# Altium footprint library GyokuRe.PcbLib: 1248 footprints (part 45 of 78)
Each footprint in its own frame and in the unit in brackets; x right, y up, seen from the top. Pads: shape width x height; smd on the part's side, far side on the other; paste and mask are expansions set on the pad; w line width, h text height; cw(c..) or ccw(c..) is an arc to the next point about the centre after c.
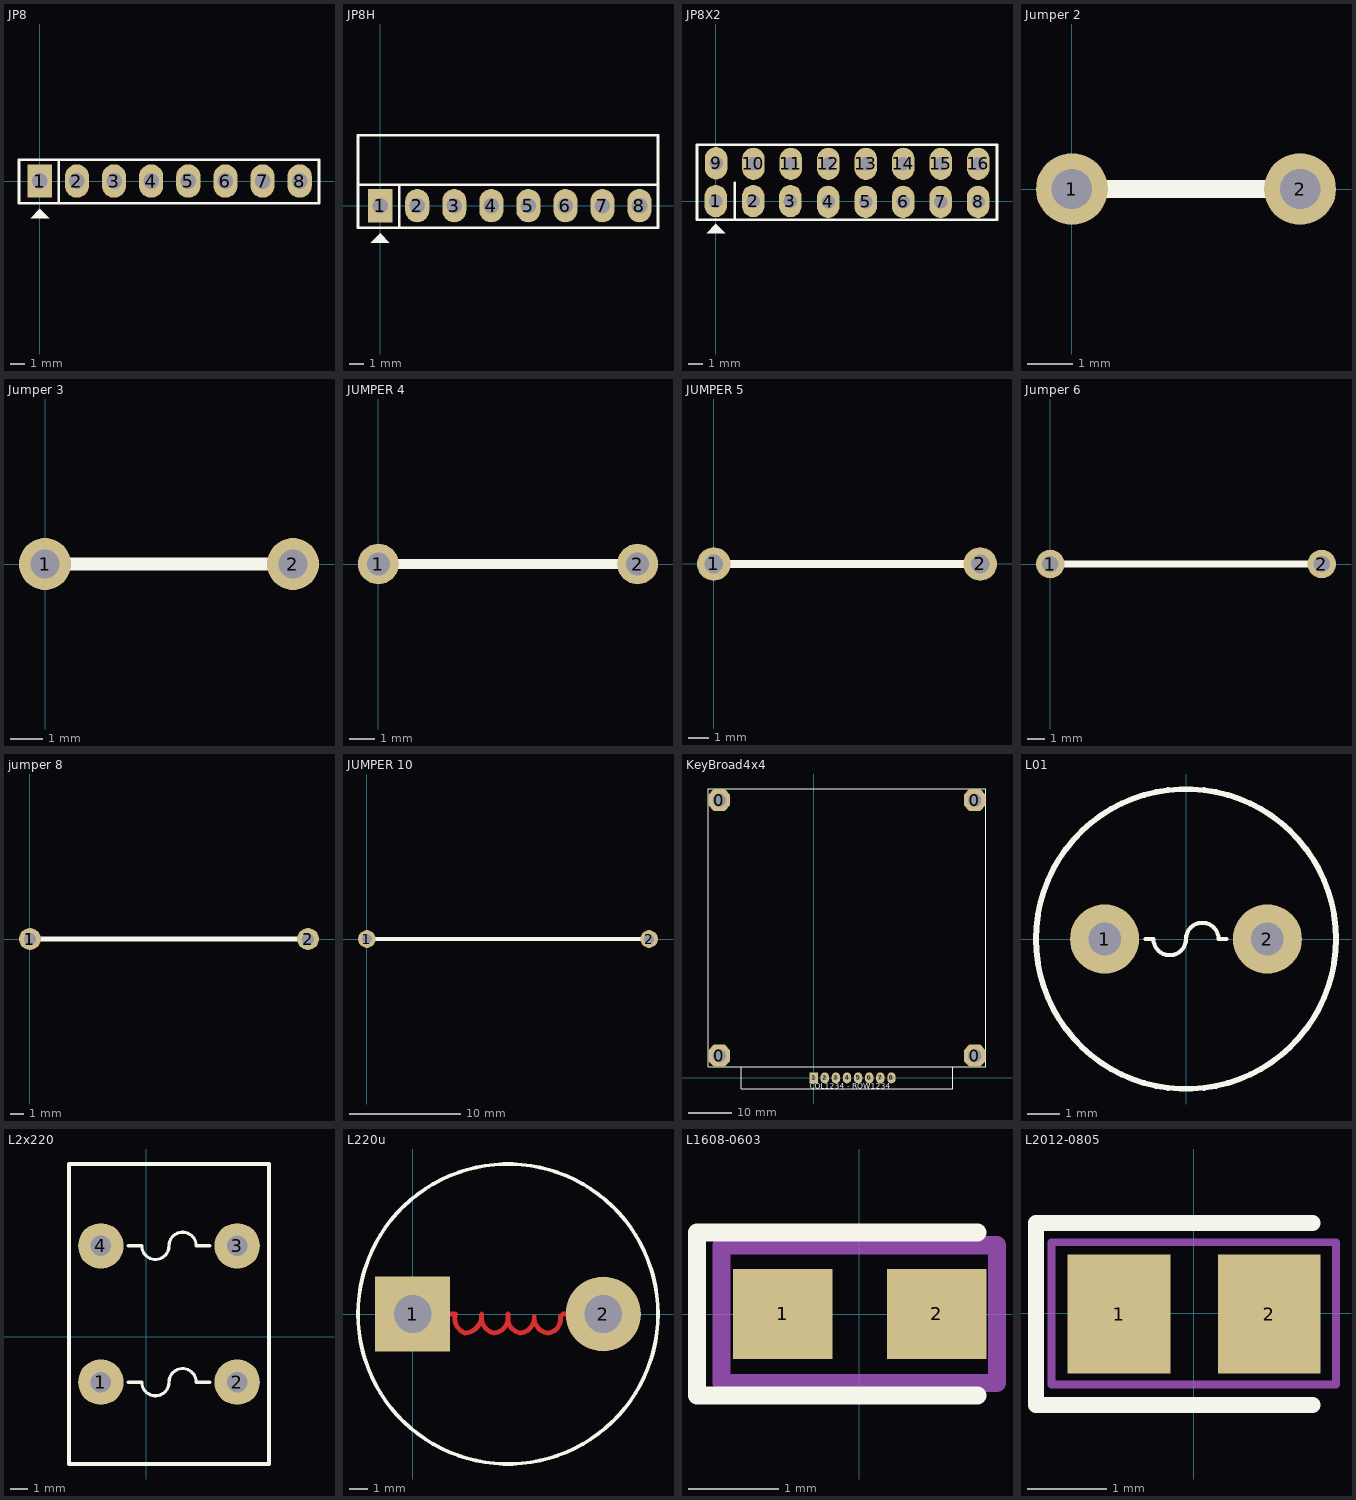
[diagram p44: the footprints below, top view; thin cyan lines are the x and y axes]

## JP8 [mil] "JP8"
height 200
pads (8):
  rect 65x90 hole 42: 1(0,0)
  oval 65x90 hole 42: 2(100,0) 3(200,0) 4(300,0) 5(400,0) 6(500,0) 7(600,0) 8(700,0)
Top Overlay:
  region: 0,-75 -25,-100 25,-100
  lines w7: 51,-60 51,56 ; -56,-60 752,-60 752,57 -56,57 -56,-60
3D body "JP1-8.stp": height 323.43, standoff -117.51, extent -48.03,-50 748.03,48.43

## JP8H [mil]
pads (8):
  rect 65x90 hole 42: 1(0,0)
  oval 65x90 hole 42: 2(100,0) 3(200,0) 4(300,0) 5(400,0) 6(500,0) 7(600,0) 8(700,0)
Top Overlay:
  region: 0,-75 -25,-100 25,-100
  lines w7: 51,-60 51,56 ; -60,57 -60,190 750,190 750,57 ; -60,57 750,57 ; -60,57 -60,-60 750,-60 750,57
3D body "JP8H.stp": height 49.21, standoff -143.7, extent -46.06,-14.96 746.06,423.62

## JP8X2 [mil]
pads (16):
  oval 60x86 hole 36: 1(-0.5,0.5) 2(99.5,0.5) 3(198.5,0.5) 4(299.5,-1.5) 5(399.5,-1.5) 6(499.5,-1.5) 7(599.5,-1.5) 8(699.5,-1.5) 9(0.5,101.5) 10(100,100) 11(200,100) 12(300,100) 13(400,100) 14(500,100) 15(600,100) 16(700,100)
Top Overlay:
  region: 0,-60 -25,-85 25,-85
  lines w7: 50,-49 50,49 ; -50.5,-49.5 750,-49.5 750,150.5 -50.5,150.5 -50.5,50.5 -50.5,-49.5
3D body "JP8X2.stp": height 335.25, standoff -117.51, extent -49.99,-49.99 750.01,150.01

## Jumper 2 [mm]
pads (2):
  round 1.6 hole 0.9: 1(0,0) 2(5.08,0)
Top Overlay:
  lines w0.4: 0,0 5.08,0

## Jumper 3 [mm]
pads (2):
  round 1.6 hole 0.9: 1(0,0) 2(7.62,0)
Top Overlay:
  lines w0.4: 0,0 7.62,0

## JUMPER 4 [mm]
pads (2):
  round 1.6 hole 0.9: 1(0,0) 2(10.16,0)
Top Overlay:
  lines w0.4: 0,0 10.16,0

## JUMPER 5 [mm]
pads (2):
  round 1.6 hole 0.9: 1(0,0) 2(12.7,0)
Top Overlay:
  lines w0.4: 0,0 12.7,0

## Jumper 6 [mm]
pads (2):
  round 1.6 hole 0.9: 1(0,0) 2(15.24,0)
Top Overlay:
  lines w0.4: 0,0 15.24,0

## jumper 8 [mm]
pads (2):
  round 1.6 hole 0.9: 1(0,0) 2(20.32,0)
Top Overlay:
  lines w0.4: 0,0 20.32,0

## JUMPER 10 [mm]
pads (2):
  round 1.6 hole 0.9: 1(0,0) 2(25.4,0)
Top Overlay:
  lines w0.4: 0,0 25.4,0

## KeyBroad4x4 [mm] "KeyBroad 4x4"
height 5.08
pads (12):
  oct 5x5 hole 3.048: 0(-21.59,5.08) 0(-21.59,63.5) 0(36.83,5.08) 0(36.83,63.5)
  rect 1.905x2.5 hole 1: 1(0,0)
  oval 1.905x2.5 hole 1: 2(2.54,0) 3(5.08,0) 4(7.62,0) 5(10.16,0) 6(12.7,0) 7(15.24,0) 8(17.78,0)
Top Overlay:
  lines w0.203: -16.51,2.54 -16.51,-2.515 -16.535,-2.54 31.75,-2.54 31.75,2.489 ; -24.13,2.54 39.37,2.54 39.37,66.04 -24.13,66.04 -24.13,2.54
  text "COL1234 - ROW1234" at -0.889,-2.464 h1.27

## L01 [mil] "Inductor"
pads (2):
  round 85 hole 40: 1(-100,0) 2(100,0)
Top Overlay:
  circle w7: c0,0 r184.39
  lines w5: -50,0 -40,0 ccw(c-20,0) 0,0 cw(c20,0) 40,0 50,0

## L2x220 [mil] "Loc 220"
pads (4):
  round 100 hole 45: 1(-100,-100) 2(200,-100) 3(200,200) 4(-100,200)
Top Overlay:
  lines w7: -10,-100 ccw(c20,-100) 50,-100 cw(c80,-100) 110,-100 ; -10,200 ccw(c20,200) 50,200 cw(c80,200) 110,200
  lines w8: -40,-100 -10,-100 ; -40,200 -10,200 ; 110,-100 140,-100 ; 110,200 140,200 ; -170,-280 -170,380 270,380 270,-280 -170,-280

## L220u [mm]
pads (2):
  rect 4x4 hole 2: 1(0,0)
  round 4 hole 2: 2(10.16,0)
Top Layer:
  lines w0.254: 1.651,0 2.159,0 ; 2.286,0 ccw(c3.048,-0.254) 2.794,-1.016 ccw(c2.73,-0.064) 3.683,0 ccw(c4.508,-0.191) 4.318,-1.016 ccw(c4.255,-0.191) 5.08,-0.127 ; 5.08,0 ccw(c5.905,-0.191) 5.715,-1.016 ccw(c5.651,-0.191) 6.477,-0.127 ccw(c7.302,-0.191) 7.239,-1.016 ccw(c7.112,-0.254) 7.874,-0.127 ; 8.001,0 8.509,0
Top Overlay:
  circle w0.2: c5.08,0 r8

## L1608-0603 [mm] "Inductor Chip 0603 package"
pads (2):
  rect 1.1x1 smd: 1(-0.843,0.001) 2(0.857,0.001)
Top Overlay:
  lines w0.2: 1.307,-0.899 -1.793,-0.899 -1.793,0.901 1.307,0.901
Mechanical 13:
  lines w0.2: -1.524,-0.762 1.524,-0.762 1.524,0.762 -1.524,0.762 -1.524,-0.762
3D body: height 0.81, standoff 0, extent 0.356,-0.432 0.711,0.432
3D body: height 0.81, standoff 0, extent -0.711,-0.432 -0.356,0.432
3D body: height 0.76, standoff 0, extent -0.356,-0.406 0.356,0.406

## L2012-0805 [mm] "Inductor Chip 0805 package"
pads (2):
  rect 1.3x1.5 smd: 1(-0.945,-0.007) 2(0.955,-0.007)
Top Overlay:
  lines w0.2: 1.505,-1.157 -1.995,-1.157 -1.995,1.143 1.505,1.143
Mechanical 13:
  lines w0.1: -1.8,-0.9 1.8,-0.9 1.8,0.9 -1.8,0.9 -1.8,-0.9
3D body: height 0.76, standoff 0, extent -0.381,-0.572 0.381,0.572
3D body: height 0.79, standoff 0, extent 0.381,-0.584 0.889,0.584
3D body: height 0.79, standoff 0, extent -0.889,-0.584 -0.381,0.584